# Altium footprint library Connectors.PcbLib: 158 footprints (part 2 of 10)
Each footprint in its own frame and in the unit in brackets; x right, y up, seen from the top. Pads: shape width x height; smd on the part's side, far side on the other; paste and mask are expansions set on the pad; w line width, h text height; cw(c..) or ccw(c..) is an arc to the next point about the centre after c.
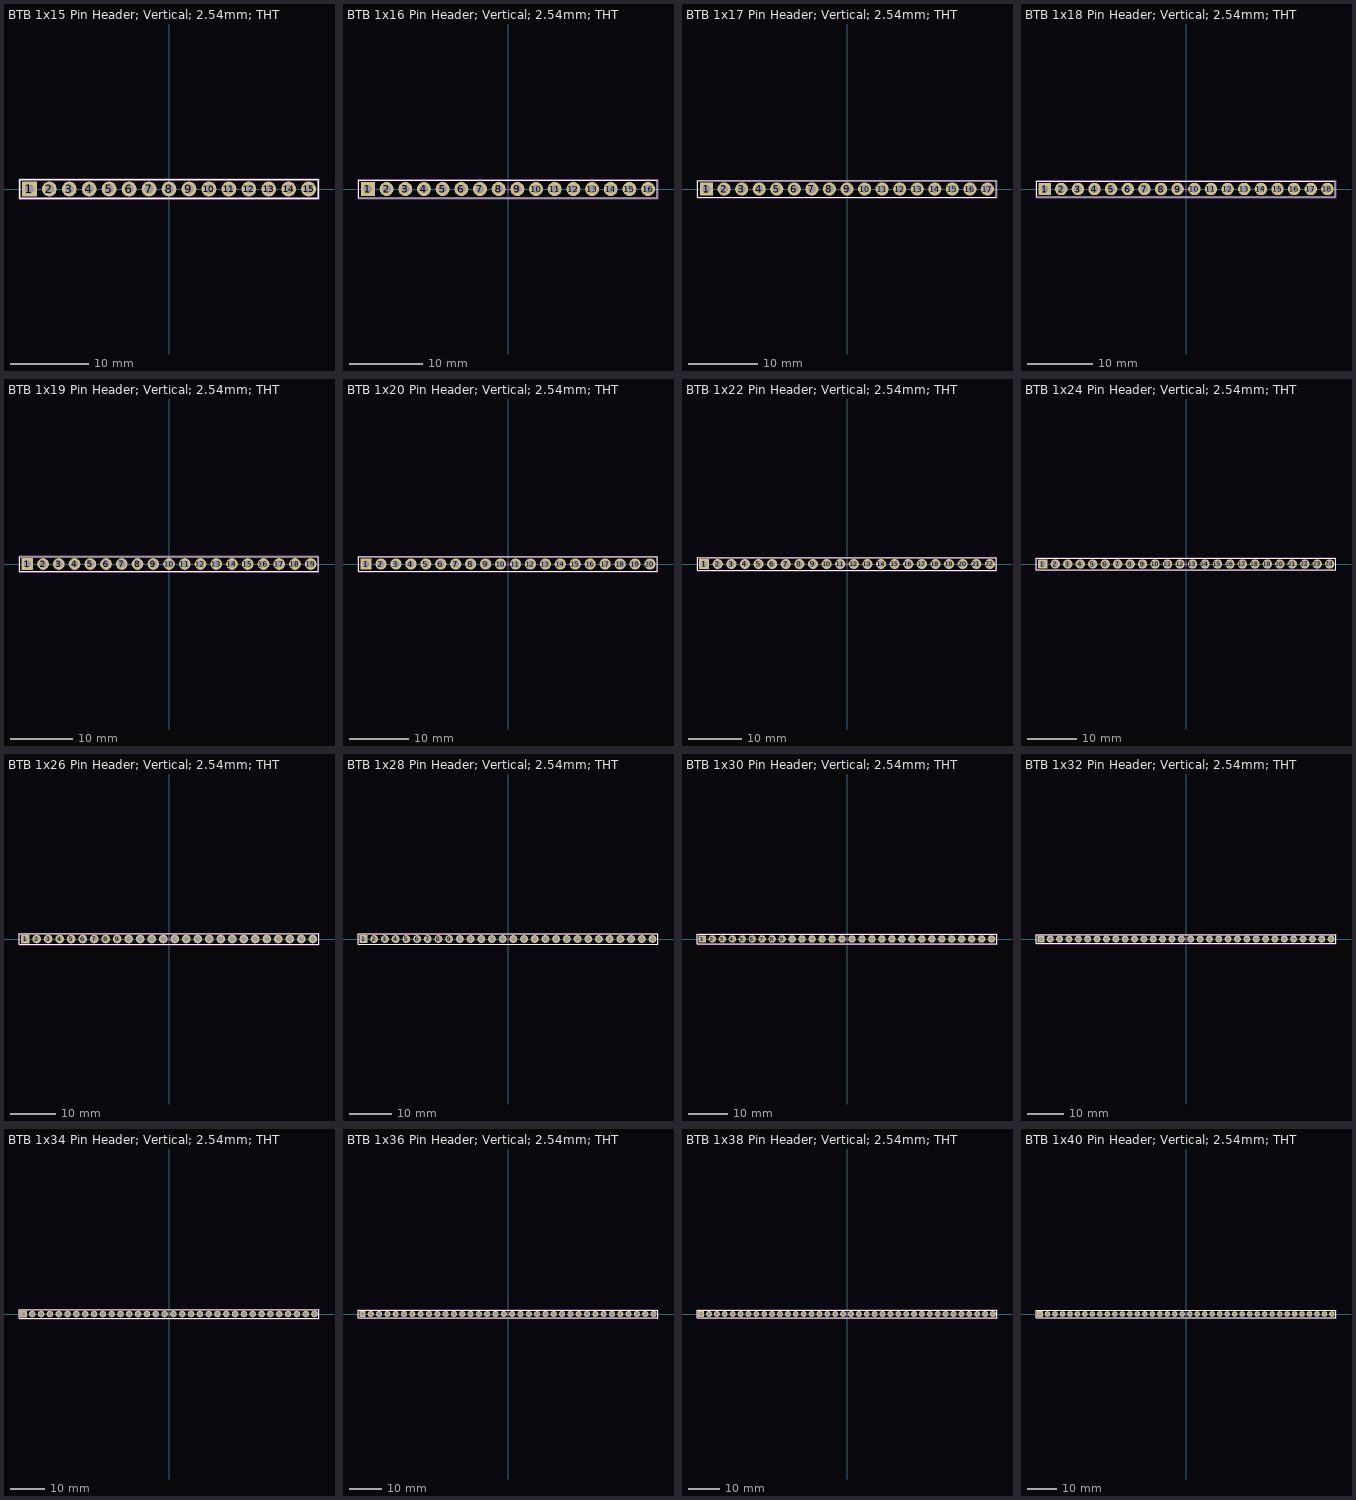
[diagram p1: the footprints below, top view; thin cyan lines are the x and y axes]

## BTB 1x15 Pin Header; Vertical; 2.54mm; THT [mil]
pads (15):
  rect 75x75 hole 45: 1(-700,0)
  round 75 hole 45: 2(-600,0) 3(-500,0) 4(-400,0) 5(-300,0) 6(-200,0) 7(-100,0) 8(0,0) 9(100,0) 10(200,0) 11(300,0) 12(400,0) 13(500,0) 14(600,0) 15(700,0)
Top Overlay:
  lines w6.3: -748.03,-47.24 748.03,-47.24 748.03,47.24 -748.03,47.24 -748.03,-47.24
Mechanical 11:
  lines w3.94: -751.97,-51.18 751.97,-51.18 751.97,51.18 -751.97,51.18 -751.97,-51.18
Mechanical 15:
  lines w3.94: -19.68,0 19.68,0 ; 0,-19.68 0,19.68
3D body "BTB 1x7 Pin Header; Vertical; 2.54mm; THT.stp": height 337.22, standoff -117.11, extent -749.99,-49.99 -49.99,50.01
3D body "BTB 1x8 Pin Header; Vertical; 2.54mm; THT.stp": height 337.22, standoff -117.11, extent -49.99,-49.99 750.01,50.01

## BTB 1x16 Pin Header; Vertical; 2.54mm; THT [mil]
pads (16):
  rect 75x75 hole 45: 1(-750,0)
  round 75 hole 45: 2(-650,0) 3(-550,0) 4(-450,0) 5(-350,0) 6(-250,0) 7(-150,0) 8(-50,0) 9(50,0) 10(150,0) 11(250,0) 12(350,0) 13(450,0) 14(550,0) 15(650,0) 16(750,0)
Top Overlay:
  lines w6.3: -799.21,-47.24 -799.21,47.24 799.21,47.24 799.21,-47.24 -799.21,-47.24
Mechanical 11:
  lines w3.94: -803.15,-51.18 -803.15,51.18 803.15,51.18 803.15,-51.18 -803.15,-51.18
Mechanical 15:
  lines w3.94: -19.68,0 19.68,0 ; 0,-19.68 0,19.68
3D body "BTB 1x16 Pin Header; Vertical; 2.54mm; THT.stp": height 337.22, standoff -117.11, extent -799.99,-49.99 800.01,50.01

## BTB 1x17 Pin Header; Vertical; 2.54mm; THT [mil]
pads (17):
  rect 75x75 hole 45: 1(-800,0)
  round 75 hole 45: 2(-700,0) 3(-600,0) 4(-500,0) 5(-400,0) 6(-300,0) 7(-200,0) 8(-100,0) 9(0,0) 10(100,0) 11(200,0) 12(300,0) 13(400,0) 14(500,0) 15(600,0) 16(700,0) 17(800,0)
Top Overlay:
  lines w6.3: -850.39,-47.24 -850.39,47.24 850.39,47.24 850.39,-47.24 -850.39,-47.24
Mechanical 11:
  lines w3.94: -854.33,-51.18 -854.33,51.18 854.33,51.18 854.33,-51.18 -854.33,-51.18
Mechanical 15:
  lines w3.94: -19.68,0 19.68,0 ; 0,-19.68 0,19.68
3D body "BTB 1x9 Pin Header; Vertical; 2.54mm; THT.stp": height 337.22, standoff -117.11, extent -49.99,-49.99 850.01,50.01
3D body "BTB 1x8 Pin Header; Vertical; 2.54mm; THT.stp": height 337.22, standoff -117.11, extent -849.99,-49.99 -49.99,50.01

## BTB 1x18 Pin Header; Vertical; 2.54mm; THT [mil]
pads (18):
  rect 75x75 hole 45: 1(-850,0)
  round 75 hole 45: 2(-750,0) 3(-650,0) 4(-550,0) 5(-450,0) 6(-350,0) 7(-250,0) 8(-150,0) 9(-50,0) 10(50,0) 11(150,0) 12(250,0) 13(350,0) 14(450,0) 15(550,0) 16(650,0) 17(750,0) 18(850,0)
Top Overlay:
  lines w6.3: -897.64,-47.24 897.64,-47.24 897.64,47.24 -897.64,47.24 -897.64,-47.24
Mechanical 11:
  lines w3.94: -901.57,-51.18 -901.57,51.18 901.57,51.18 901.57,-51.18 -901.57,-51.18
Mechanical 15:
  lines w3.94: -19.68,0 19.68,0 ; 0,-19.68 0,19.68
3D body "BTB 1x18 Pin Header; Vertical; 2.54mm; THT.stp": height 337.22, standoff -117.11, extent -899.99,-49.99 900.01,50.01

## BTB 1x19 Pin Header; Vertical; 2.54mm; THT [mil]
pads (19):
  rect 75x75 hole 45: 1(-900,0)
  round 75 hole 45: 2(-800,0) 3(-700,0) 4(-600,0) 5(-500,0) 6(-400,0) 7(-300,0) 8(-200,0) 9(-100,0) 10(0,0) 11(100,0) 12(200,0) 13(300,0) 14(400,0) 15(500,0) 16(600,0) 17(700,0) 18(800,0) 19(900,0)
Top Overlay:
  lines w6.3: -948.82,-47.24 948.82,-47.24 948.82,47.24 -948.82,47.24 -948.82,-47.24
Mechanical 11:
  lines w3.94: -952.76,-51.18 952.76,-51.18 952.76,51.18 -952.76,51.18 -952.76,-51.18
Mechanical 15:
  lines w3.94: -19.68,0 19.68,0 ; 0,-19.68 0,19.68
3D body "BTB 1x9 Pin Header; Vertical; 2.54mm; THT.stp": height 337.22, standoff -117.11, extent -949.99,-49.99 -49.99,50.01
3D body "BTB 1x10 Pin Header; Vertical; 2.54mm; THT.stp": height 337.22, standoff -117.11, extent -49.99,-49.99 950.01,50.01

## BTB 1x20 Pin Header; Vertical; 2.54mm; THT [mil]
pads (20):
  rect 75x75 hole 45: 1(-950,0)
  round 75 hole 45: 2(-850,0) 3(-750,0) 4(-650,0) 5(-550,0) 6(-450,0) 7(-350,0) 8(-250,0) 9(-150,0) 10(-50,0) 11(50,0) 12(150,0) 13(250,0) 14(350,0) 15(450,0) 16(550,0) 17(650,0) 18(750,0) 19(850,0) 20(950,0)
Top Overlay:
  lines w6.3: -1000,-47.24 1000,-47.24 1000,47.24 -1000,47.24 -1000,-47.24
Mechanical 11:
  lines w3.94: -1003.94,-51.18 1003.94,-51.18 1003.94,51.18 -1003.94,51.18 -1003.94,-51.18
Mechanical 15:
  lines w3.94: -19.68,0 19.68,0 ; 0,-19.68 0,19.68
3D body "BTB 1x20 Pin Header; Vertical; 2.54mm; THT.stp": height 337.22, standoff -117.11, extent -999.99,-49.99 1000.01,50.01

## BTB 1x22 Pin Header; Vertical; 2.54mm; THT [mil]
pads (22):
  rect 75x75 hole 45: 1(-1050,0)
  round 75 hole 45: 2(-950,0) 3(-850,0) 4(-750,0) 5(-650,0) 6(-550,0) 7(-450,0) 8(-350,0) 9(-250,0) 10(-150,0) 11(-50,0) 12(50,0) 13(150,0) 14(250,0) 15(350,0) 16(450,0) 17(550,0) 18(650,0) 19(750,0) 20(850,0) 21(950,0) 22(1050.01,0.01)
Top Overlay:
  lines w6.3: -1098.43,-47.24 1098.43,-47.24 1098.43,47.24 -1098.43,47.24 -1098.43,-47.24
Mechanical 11:
  lines w3.94: -1102.36,-51.18 1102.36,-51.18 1102.36,51.18 -1102.36,51.18 -1102.36,-51.18
Mechanical 15:
  lines w3.94: -19.68,0 19.68,0 ; 0,-19.68 0,19.68
3D body "BTB 1x10 Pin Header; Vertical; 2.54mm; THT.stp": height 337.2, standoff -117.13, extent -1099.99,-49.99 -99.99,50.01
3D body "BTB 1x12 Pin Header; Vertical; 2.54mm; THT.stp": height 337.2, standoff -117.13, extent -99.99,-49.99 1100.01,50.01

## BTB 1x24 Pin Header; Vertical; 2.54mm; THT [mil]
pads (24):
  rect 75x75 hole 45: 1(-1150,0)
  round 75 hole 45: 2(-1050,0) 3(-950,0) 4(-850,0) 5(-750,0) 6(-650,0) 7(-550,0) 8(-450,0) 9(-350,0) 10(-250,0) 11(-150,0) 12(-50,0) 13(50,0) 14(150,0) 15(250,0) 16(350,0) 17(450,0) 18(550,0) 19(650,0) 20(750,0) 21(850,0) 22(950.01,0.01) 23(1050.01,0.01) 24(1150.01,0.01)
Top Overlay:
  lines w6.3: -1200.79,-47.24 -1200.79,47.24 1196.85,47.24 1196.85,-47.24 -1200.79,-47.24
Mechanical 11:
  lines w3.94: -1204.72,-51.18 -1204.72,51.18 1200.79,51.18 1200.79,-51.18 -1204.72,-51.18
Mechanical 15:
  lines w3.94: -19.68,0 19.68,0 ; 0,-19.68 0,19.68
3D body "BTB 1x12 Pin Header; Vertical; 2.54mm; THT.stp": height 337.2, standoff -117.13, extent 0,-50 1200,50
3D body "BTB 1x12 Pin Header; Vertical; 2.54mm; THT.stp": height 337.2, standoff -117.13, extent -1200,-50 0,50

## BTB 1x26 Pin Header; Vertical; 2.54mm; THT [mil]
pads (26):
  rect 75x75 hole 45: 1(-1250,0)
  round 75 hole 45: 2(-1150,0) 3(-1050,0) 4(-950,0) 5(-850,0) 6(-750,0) 7(-650,0) 8(-550,0) 9(-450,0) 10(-350,0) 11(-250,0) 12(-150,0) 13(-50,0) 14(50,0) 15(150,0) 16(250,0) 17(350,0) 18(450,0) 19(550,0) 20(650,0) 21(750,0) 22(850.01,0.01) 23(950.01,0.01) 24(1050.01,0.01) 25(1150,0) 26(1250,0)
Top Overlay:
  lines w6.3: -1299.21,-47.24 -1299.21,47.24 1299.21,47.24 1299.21,-47.24 -1299.21,-47.24
Mechanical 11:
  lines w3.94: -1303.15,-51.18 -1303.15,51.18 1303.15,51.18 1303.15,-51.18 -1303.15,-51.18
Mechanical 15:
  lines w3.94: -19.68,0 19.68,0 ; 0,-19.68 0,19.68
3D body "BTB 1x14 Pin Header; Vertical; 2.54mm; THT.stp": height 337.2, standoff -117.13, extent -100,-50 1300,50
3D body "BTB 1x12 Pin Header; Vertical; 2.54mm; THT.stp": height 337.2, standoff -117.13, extent -1300,-50 -100,50

## BTB 1x28 Pin Header; Vertical; 2.54mm; THT [mil]
pads (28):
  rect 75x75 hole 45: 1(-1350,0)
  round 75 hole 45: 2(-1250,0) 3(-1150,0) 4(-1050,0) 5(-950,0) 6(-850,0) 7(-750,0) 8(-650,0) 9(-550,0) 10(-450,0) 11(-350,0) 12(-250,0) 13(-150,0) 14(-50,0) 15(50,0) 16(150,0) 17(250,0) 18(350,0) 19(450,0) 20(550,0) 21(650,0) 22(750.01,0.01) 23(850.01,0.01) 24(950.01,0.01) 25(1050,0) 26(1150,0) 27(1250,0) 28(1350,0)
Top Overlay:
  lines w6.3: -1397.64,-47.24 -1397.64,47.24 1397.64,47.24 1397.64,-47.24 -1397.64,-47.24
Mechanical 11:
  lines w3.94: -1401.57,-51.18 -1401.57,51.18 1401.57,51.18 1401.57,-51.18 -1401.57,-51.18
Mechanical 15:
  lines w3.94: -19.68,0 19.68,0 ; 0,-19.68 0,19.68
3D body "BTB 1x14 Pin Header; Vertical; 2.54mm; THT.stp": height 337.2, standoff -117.13, extent 0,-50 1400,50
3D body "BTB 1x14 Pin Header; Vertical; 2.54mm; THT.stp": height 337.2, standoff -117.13, extent -1400,-50 0,50

## BTB 1x30 Pin Header; Vertical; 2.54mm; THT [mil]
pads (30):
  rect 75x75 hole 45: 1(-1450,0)
  round 75 hole 45: 2(-1350,0) 3(-1250,0) 4(-1150,0) 5(-1050,0) 6(-950,0) 7(-850,0) 8(-750,0) 9(-650,0) 10(-550,0) 11(-450,0) 12(-350,0) 13(-250,0) 14(-150,0) 15(-50,0) 16(50,0) 17(150,0) 18(250,0) 19(350,0) 20(450,0) 21(550,0) 22(650.01,0.01) 23(750.01,0.01) 24(850.01,0.01) 25(950,0) 26(1050,0) 27(1150,0) 28(1250,0) 29(1350,0) 30(1450,0)
Top Overlay:
  lines w6.3: -1500,-47.24 -1500,47.24 1500,47.24 1500,-47.24 -1500,-47.24
Mechanical 11:
  lines w3.94: -1503.94,-51.18 -1503.94,51.18 1503.94,51.18 1503.94,-51.18 -1503.94,-51.18
Mechanical 15:
  lines w3.94: -19.68,0 19.68,0 ; 0,-19.68 0,19.68
3D body "BTB 1x16 Pin Header; Vertical; 2.54mm; THT.stp": height 337.2, standoff -117.13, extent -100,-50 1500,50
3D body "BTB 1x14 Pin Header; Vertical; 2.54mm; THT.stp": height 337.2, standoff -117.13, extent -1500,-50 -100,50

## BTB 1x32 Pin Header; Vertical; 2.54mm; THT [mil]
pads (32):
  rect 75x75 hole 45: 1(-1550,0)
  round 75 hole 45: 2(-1450,0) 3(-1350,0) 4(-1250,0) 5(-1150,0) 6(-1050,0) 7(-950,0) 8(-850,0) 9(-750,0) 10(-650,0) 11(-550,0) 12(-450,0) 13(-350,0) 14(-250,0) 15(-150,0) 16(-50,0) 17(50,0) 18(150,0) 19(250,0) 20(350,0) 21(450,0) 22(550.01,0.01) 23(650.01,0.01) 24(750.01,0.01) 25(850,0) 26(950,0) 27(1050,0) 28(1150,0) 29(1250,0) 30(1350,0) 31(1450,0) 32(1550,0)
Top Overlay:
  lines w6.3: -1598.43,-47.24 -1598.43,47.24 1598.43,47.24 1598.43,-47.24 -1598.43,-47.24
Mechanical 11:
  lines w3.94: -1602.36,-51.18 -1602.36,51.18 1602.36,51.18 1602.36,-51.18 -1602.36,-51.18
Mechanical 15:
  lines w3.94: -19.68,0 19.68,0 ; 0,-19.68 0,19.68
3D body "BTB 1x16 Pin Header; Vertical; 2.54mm; THT.stp": height 337.2, standoff -117.13, extent 0,-50 1600,50
3D body "BTB 1x16 Pin Header; Vertical; 2.54mm; THT.stp": height 337.2, standoff -117.13, extent -1600,-50 0,50

## BTB 1x34 Pin Header; Vertical; 2.54mm; THT [mil]
pads (34):
  rect 75x75 hole 45: 1(-1650,0)
  round 75 hole 45: 2(-1550,0) 3(-1450,0) 4(-1350,0) 5(-1250,0) 6(-1150,0) 7(-1050,0) 8(-950,0) 9(-850,0) 10(-750,0) 11(-650,0) 12(-550,0) 13(-450,0) 14(-350,0) 15(-250,0) 16(-150,0) 17(-50,0) 18(50,0) 19(150,0) 20(250,0) 21(350,0) 22(450.01,0.01) 23(550.01,0.01) 24(650.01,0.01) 25(750,0) 26(850,0) 27(950,0) 28(1050,0) 29(1150,0) 30(1250,0) 31(1350,0) 32(1450,0) 33(1550,0) 34(1650,0)
Top Overlay:
  lines w6.3: -1696.85,-47.24 1696.85,-47.24 1696.85,47.24 -1696.85,47.24 -1696.85,-47.24
Mechanical 11:
  lines w3.94: -1700.79,-51.18 1700.79,-51.18 1700.79,51.18 -1700.79,51.18 -1700.79,-51.18
Mechanical 15:
  lines w3.94: -19.68,0 19.68,0 ; 0,-19.68 0,19.68
3D body "BTB 1x16 Pin Header; Vertical; 2.54mm; THT.stp": height 337.2, standoff -117.13, extent -1700,-50 -100,50
3D body "BTB 1x18 Pin Header; Vertical; 2.54mm; THT.stp": height 337.2, standoff -117.13, extent -100,-50 1700,50

## BTB 1x36 Pin Header; Vertical; 2.54mm; THT [mil]
pads (36):
  rect 75x75 hole 45: 1(-1750,0)
  round 75 hole 45: 2(-1650,0) 3(-1550,0) 4(-1450,0) 5(-1350,0) 6(-1250,0) 7(-1150,0) 8(-1050,0) 9(-950,0) 10(-850,0) 11(-750,0) 12(-650,0) 13(-550,0) 14(-450,0) 15(-350,0) 16(-250,0) 17(-150,0) 18(-50,0) 19(50,0) 20(150,0) 21(250,0) 22(350.01,0.01) 23(450.01,0.01) 24(550.01,0.01) 25(650,0) 26(750,0) 27(850,0) 28(950,0) 29(1050,0) 30(1150,0) 31(1250,0) 32(1350,0) 33(1450,0) 34(1550,0) 35(1650,0) 36(1750,0)
Top Overlay:
  lines w6.3: -1799.21,-47.24 -1799.21,47.24 1799.21,47.24 1799.21,-47.24 -1799.21,-47.24
Mechanical 11:
  lines w3.94: -1803.15,-51.18 -1803.15,51.18 1803.15,51.18 1803.15,-51.18 -1803.15,-51.18
Mechanical 15:
  lines w3.94: -19.68,0 19.68,0 ; 0,-19.68 0,19.68
3D body "BTB 1x18 Pin Header; Vertical; 2.54mm; THT.stp": height 337.2, standoff -117.13, extent 0,-50 1800,50
3D body "BTB 1x18 Pin Header; Vertical; 2.54mm; THT.stp": height 337.2, standoff -117.13, extent -1800,-50 0,50

## BTB 1x38 Pin Header; Vertical; 2.54mm; THT [mil]
pads (38):
  rect 75x75 hole 45: 1(-1850,0)
  round 75 hole 45: 2(-1750,0) 3(-1650,0) 4(-1550,0) 5(-1450,0) 6(-1350,0) 7(-1250,0) 8(-1150,0) 9(-1050,0) 10(-950,0) 11(-850,0) 12(-750,0) 13(-650,0) 14(-550,0) 15(-450,0) 16(-350,0) 17(-250,0) 18(-150,0) 19(-50,0) 20(50,0) 21(150,0) 22(250.01,0.01) 23(350.01,0.01) 24(450.01,0.01) 25(550,0) 26(650,0) 27(750,0) 28(850,0) 29(950,0) 30(1050,0) 31(1150,0) 32(1250,0) 33(1350,0) 34(1450,0) 35(1550,0) 36(1650,0) 37(1750,0) 38(1850,0)
Top Overlay:
  lines w6.3: -1898.43,-47.24 -1898.43,47.24 1897.64,47.24 1897.64,-47.24 -1898.43,-47.24
Mechanical 11:
  lines w3.94: -1902.36,-51.18 -1902.36,51.18 1901.57,51.18 1901.57,-51.18 -1902.36,-51.18
Mechanical 15:
  lines w3.94: -19.68,0 19.68,0 ; 0,-19.68 0,19.68
3D body "BTB 1x20 Pin Header; Vertical; 2.54mm; THT.stp": height 337.2, standoff -117.13, extent -100,-50 1900,50
3D body "BTB 1x18 Pin Header; Vertical; 2.54mm; THT.stp": height 337.2, standoff -117.13, extent -1900,-50 -100,50

## BTB 1x40 Pin Header; Vertical; 2.54mm; THT [mil]
pads (40):
  rect 75x75 hole 45: 1(-1950,0)
  round 75 hole 45: 2(-1850,0) 3(-1750,0) 4(-1650,0) 5(-1550,0) 6(-1450,0) 7(-1350,0) 8(-1250,0) 9(-1150,0) 10(-1050,0) 11(-950,0) 12(-850,0) 13(-750,0) 14(-650,0) 15(-550,0) 16(-450,0) 17(-350,0) 18(-250,0) 19(-150,0) 20(-50,0) 21(50,0) 22(150.01,0.01) 23(250.01,0.01) 24(350.01,0.01) 25(450,0) 26(550,0) 27(650,0) 28(750,0) 29(850,0) 30(950,0) 31(1050,0) 32(1150,0) 33(1250,0) 34(1350,0) 35(1450,0) 36(1550,0) 37(1650,0) 38(1750,0) 39(1850,0) 40(1950,0)
Top Overlay:
  lines w6.3: -2000,-47.24 2000,-47.24 2000,47.24 -2000,47.24 -2000,-47.24
Mechanical 11:
  lines w3.94: -2003.94,-51.18 2003.94,-51.18 2003.94,51.18 -2003.94,51.18 -2003.94,-51.18
Mechanical 15:
  lines w3.94: -19.68,0 19.68,0 ; 0,-19.68 0,19.68
3D body "BTB 1x20 Pin Header; Vertical; 2.54mm; THT.stp": height 337.2, standoff -117.13, extent -2000,-50 0,50
3D body "BTB 1x20 Pin Header; Vertical; 2.54mm; THT.stp": height 337.2, standoff -117.13, extent 0,-50 2000,50